# Altium footprint library TranDangKhoa-LIB.PcbLib: 1435 footprints (part 69 of 90)
Each footprint in its own frame and in the unit in brackets; x right, y up, seen from the top. Pads: shape width x height; smd on the part's side, far side on the other; paste and mask are expansions set on the pad; w line width, h text height; cw(c..) or ccw(c..) is an arc to the next point about the centre after c.
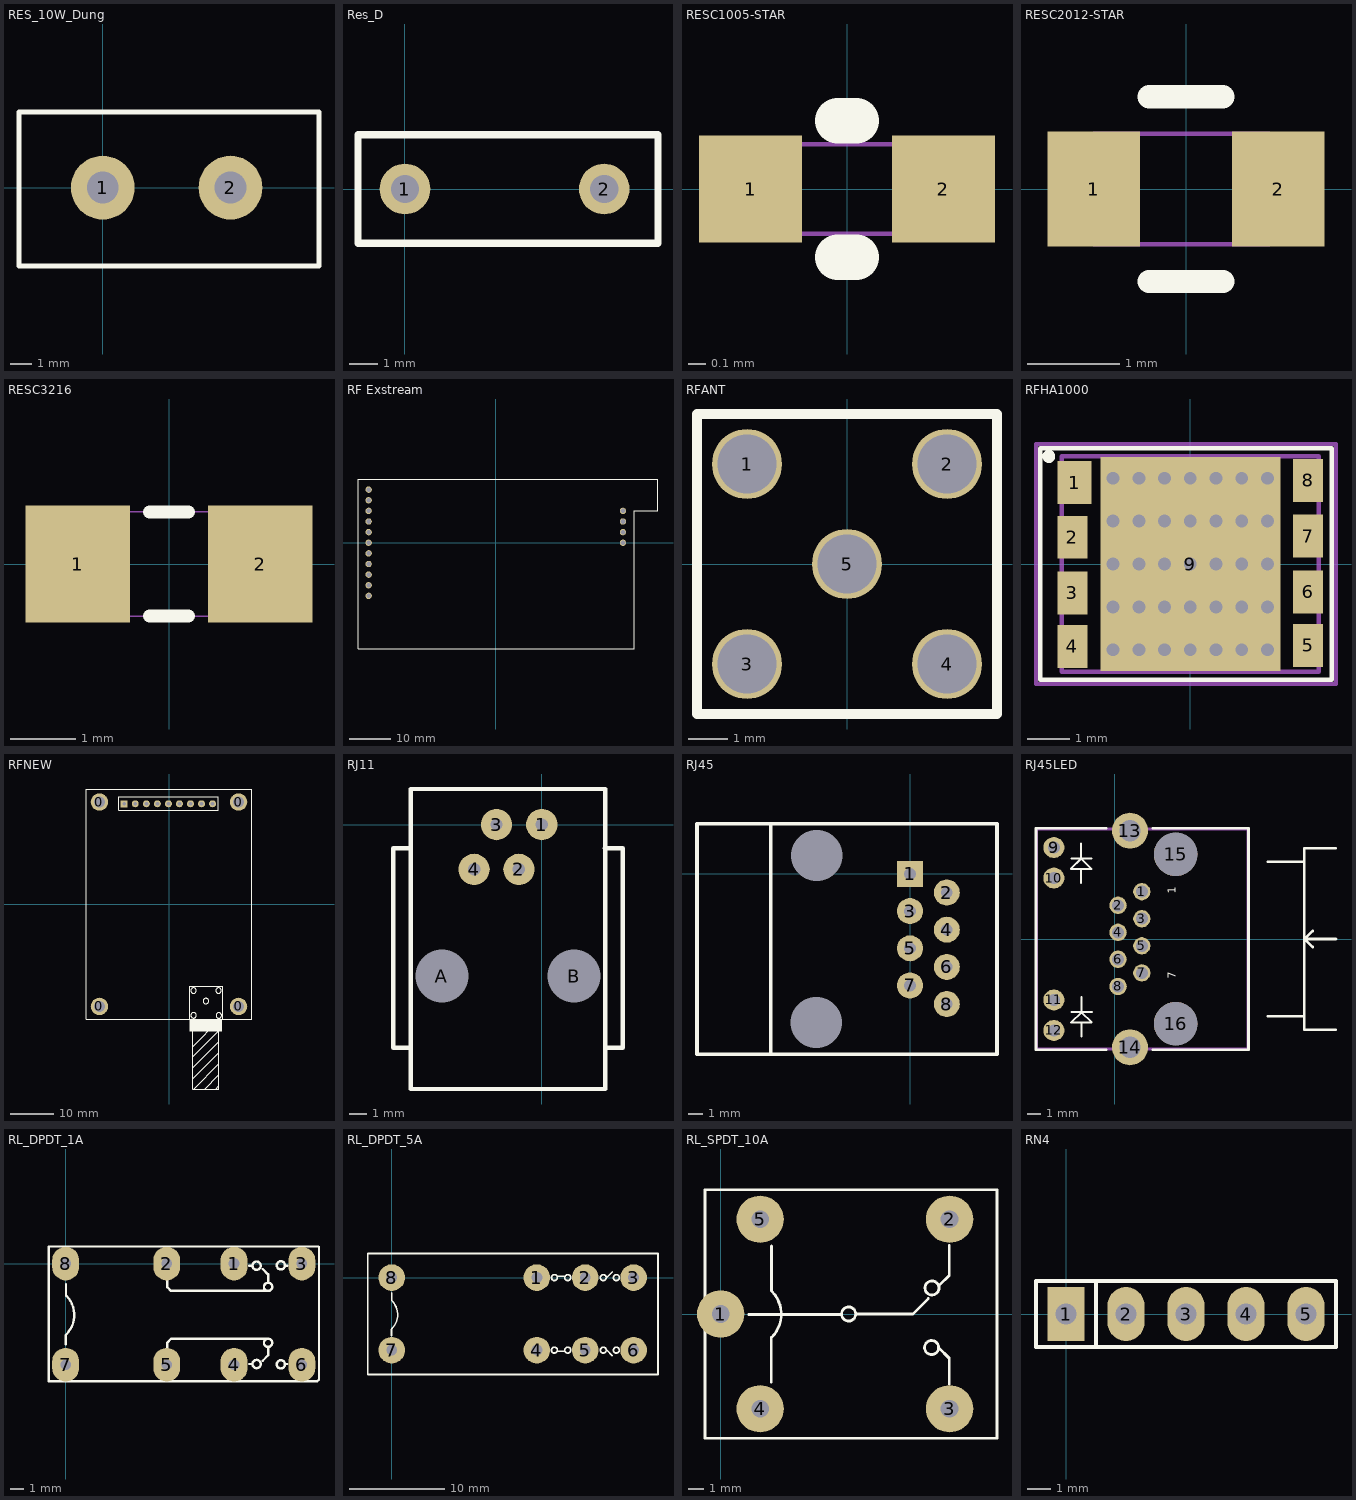
[diagram p68: the footprints below, top view; thin cyan lines are the x and y axes]

## RES_10W_Dung [mm]
pads (2):
  round 3 hole 1.5 unplated: 1(0,0) 2(6,0)
Top Overlay:
  lines w0.254: -3.937,-3.683 -3.937,0 -3.937,3.556 10.16,3.556 10.16,-3.683 -3.937,-3.683

## Res_D [mil]
pads (2):
  round 70 hole 39.37 unplated: 1(0,0) 2(275.59,0)
Top Overlay:
  lines w10: -50,75 350,75 350,-75 -65,-75 -65,75 -35,75

## RESC1005-STAR [mm]
pads (2):
  rect 0.575x0.6 smd: 1(-0.538,0) 2(0.538,0)
Top Overlay:
  lines w0.254: -0.051,-0.381 0.051,-0.381 ; -0.051,0.381 0.051,0.381
Mechanical 7:
  lines w0.025: -0.5,-0.25 0.5,-0.25 0.5,0.25 -0.5,0.25 -0.5,-0.25
  text ".Comment" at -0.475,-0.2 h0.14
  text ".Designator" at -0.475,0.075 h0.14
3D body: height 0.25, standoff 0, extent -0.325,-0.252 0.386,0.256
3D body: height 0.1, standoff 0, extent -0.705,-0.251 -0.326,0.256
3D body: height 0.1, standoff 0, extent 0.387,-0.251 0.716,0.256

## RESC2012-STAR [mm]
pads (2):
  rect 1x1.25 smd: 1(-1,0) 2(1,0)
Top Overlay:
  lines w0.25: -0.4,-1 0.4,-1
  lines w0.254: -0.4,1 0.4,1
Mechanical 7:
  lines w0.05: -1,-0.6 -1,0.6 0.9,0.6 0.9,-0.6 -1,-0.6
  text ".Designator" at -0.9,0.15 h0.4
  text ".Comment" at -0.9,-0.475 h0.4
3D body: height 0.1, standoff 0, extent -1.031,-0.535 -0.576,0.565
3D body: height 0.1, standoff 0, extent 0.613,-0.535 1.069,0.565
3D body: height 0.25, standoff 0, extent -0.576,-0.544 0.611,0.565

## RESC3216 [mm]
pads (2):
  rect 1.6x1.8 smd: 1(-1.4,0) 2(1.4,0)
Top Overlay:
  lines w0.2: -0.3,-0.8 0.3,-0.8 ; -0.3,0.8 0.3,0.8
Mechanical 7:
  lines w0.025: -1.6,-0.8 -1.6,0.8 1.6,0.8 1.6,-0.8 -1.6,-0.8
  text ".Comment" at -1.5,-0.7 h0.5
  text ".Designator" at -1.5,0.4 h0.5
3D body: height 0.55, standoff 0, extent -1.334,-0.792 -0.71,0.85
3D body: height 0.55, standoff 0, extent 0.743,-0.809 1.367,0.833
3D body: height 0.5, standoff 0, extent -0.752,-0.765 0.816,0.801

## RF Exstream [mil] "Modul RF maxstream 900MHz"
pads (15):
  round 60 hole 43.31: 1(-1197.5,500) 2(-1197.5,400) 3(-1197.5,300) 4(-1197.5,200) 5(-1197.5,100) 6(-1197.5,0) 7(-1197.5,-100) 8(-1197.5,-200) 9(-1197.5,-300) 10(-1197.5,-400) 11(-1197.5,-500) 12(1197.5,300) 13(1197.5,200) 14(1197.5,100) 15(1197.5,0)
Top Overlay:
  lines w10: -1297.5,-1000 1302.5,-1000 1302.5,300 1527.5,300 1527.5,600 -1297.5,600 -1297.5,-1000

## RFANT [mil]
pads (5):
  round 70 hole 59.06 unplated: 1(-100,100) 2(100,100) 3(-100,-100) 4(100,-100) 5(0,0)
Top Overlay:
  lines w10: -150,-150 150,-150 150,150 -150,150 -150,100 -150,-150

## RFHA1000 [mm]
pads (9):
  rect 0.8x1 smd mask+0.01: 1(-2.7,1.9)
  rect 0.7x1 smd mask+0.01: 2(-2.75,0.625) 3(-2.75,-0.675) 4(-2.75,-1.925) 5(2.75,-1.9) 6(2.75,-0.65) 7(2.75,0.65) 8(2.75,1.95)
  rect 4.2x5 smd mask+0.01: 9(0,0)
via 1.8,-2 diameter 0.6 hole 0.3
via 1.2,-2 diameter 0.6 hole 0.3
via 0.6,-2 diameter 0.6 hole 0.3
via 0,-2 diameter 0.6 hole 0.3
via -0.6,-2 diameter 0.6 hole 0.3
via -1.2,-2 diameter 0.6 hole 0.3
via -1.8,-2 diameter 0.6 hole 0.3
via 1.8,-1 diameter 0.6 hole 0.3
via 1.2,-1 diameter 0.6 hole 0.3
via 0.6,-1 diameter 0.6 hole 0.3
via 0,-1 diameter 0.6 hole 0.3
via -0.6,-1 diameter 0.6 hole 0.3
via -1.2,-1 diameter 0.6 hole 0.3
via -1.8,-1 diameter 0.6 hole 0.3
via 1.8,0 diameter 0.6 hole 0.3
via 1.2,0 diameter 0.6 hole 0.3
via 0.6,0 diameter 0.6 hole 0.3
via 0,0 diameter 0.6 hole 0.3
via -0.6,0 diameter 0.6 hole 0.3
via -1.2,0 diameter 0.6 hole 0.3
via -1.8,0 diameter 0.6 hole 0.3
via 1.8,1 diameter 0.6 hole 0.3
via 1.2,1 diameter 0.6 hole 0.3
via 0.6,1 diameter 0.6 hole 0.3
via 0,1 diameter 0.6 hole 0.3
via -0.6,1 diameter 0.6 hole 0.3
via -1.2,1 diameter 0.6 hole 0.3
via -1.8,1 diameter 0.6 hole 0.3
via 1.8,2 diameter 0.6 hole 0.3
via 1.2,2 diameter 0.6 hole 0.3
via 0.6,2 diameter 0.6 hole 0.3
via 0,2 diameter 0.6 hole 0.3
via -0.6,2 diameter 0.6 hole 0.3
via -1.2,2 diameter 0.6 hole 0.3
via -1.8,2 diameter 0.6 hole 0.3
Top Overlay:
  lines w0.1: -3.5,-2.7 3.3,-2.7 3.3,2.7 -3.5,2.7 -3.5,-2.7
  lines w0.254: -3.323,2.513 cw(c-3.301,2.51) -3.321,2.5
Mechanical 13:
  lines w0.1: -2.997,-2.514 -2.997,2.515 2.997,2.515 2.997,-2.514 -2.997,-2.514
Mechanical 15:
  lines w0.1: -3.6,-2.8 3.4,-2.8 3.4,2.8 -3.6,2.8 -3.6,-2.8
3D body "RFHA1000.STEP": height 1.98, standoff 0, extent -2.997,-2.514 2.997,2.515

## RFNEW [mm] "Module RF"
height 10
pads (13):
  round 4 hole 2.5: 0(-16,-23.5) 0(-16,23.5) 0(16,-23.5) 0(16,23.5)
  rect 1.6x1.6 hole 0.9: 1(-10.3,23.1)
  round 1.6 hole 0.9: 2(-7.76,23.1) 3(-5.22,23.1) 4(-2.68,23.1) 5(-0.14,23.1) 6(2.4,23.1) 7(4.94,23.1) 8(7.48,23.1) 9(10.02,23.1)
Top Overlay:
  circle w0.254: c8.497,-22.275 r0.635
  circle w0.254: c5.652,-19.862 r0.635
  circle w0.254: c11.392,-19.862 r0.635
  circle w0.254: c11.455,-25.586 r0.635
  circle w0.254: c5.652,-25.551 r0.635
  rectangle: 4.724,-29.318 12.192,-26.492
  lines w0.2: 5.5,-40.171 11.5,-34.171 ; 5.5,-37.631 11.5,-31.631 ; 5.5,-29.091 8.04,-26.551 ; 5.506,-35.085 11.5,-29.091 ; 5.582,-32.621 11.5,-26.703 ; 5.785,-42.426 11.5,-36.711 ; 8.251,-42.5 11.5,-39.251 ; 10.791,-42.5 11.5,-41.791 ; -11.57,21.59 11.29,21.59 11.29,24.765 -11.57,24.765 -11.57,21.59
  lines w0.254: 5.5,-26.5 5.5,-42.5 11.5,-42.5 11.5,-26.5 ; -19,-26.5 19,-26.5 19,26.5 -19,26.5 -19,-26.5 ; 4.724,-26.5 4.724,-20.15 4.724,-18.88 12.344,-18.88 12.344,-26.5 4.724,-26.5

## RJ11 [mil]
pads (6):
  round 70 hole 27.56 unplated: 1(0,0) 2(-51,-100) 3(-101,0) 4(-151,-100)
  round 70 hole 118.11 unplated: A(-223,-337.7) B(72.28,-337.7)
Top Overlay:
  lines w10: -291.9,-497.7 -331.27,-497.7 -331.27,-52.7 -291.9,-52.7 ; 140,-52.7 180.54,-52.7 180.54,-497.7 141.17,-497.7 ; -291.9,-589.55 141.17,-589.55 141.17,79.3 -291.9,79.3 -291.9,-589.55

## RJ45 [mil]
pads (10):
  rect 70x70 hole 31.5 unplated: 1(0,0)
  round 70 hole 31.5 unplated: 2(99,-50) 3(0,-100) 4(99,-150) 5(0,-200) 6(99,-250) 7(0,-300) 8(99,-350)
  round 70 hole 137.8 unplated: ""(-252,-400) ""(-251,50)
Top Overlay:
  lines w10: -375,-485.04 -375,135.04 -306,135.04 ; -573.05,-485.04 -510,-485.04 -408,-485.04 50,-485.04 148,-485.04 234.04,-485.04 234.04,135.04 148.37,135.03 50,135.04 -414,135.04 -509,135.04 -573.05,135.04 -573.05,-485.04

## RJ45LED [mm]
pads (16):
  round 1.3 hole 0.9: 1(2.03,3.55) 2(0.25,2.53) 3(2.03,1.52) 4(0.25,0.5) 5(2.03,-0.51) 6(0.25,-1.52) 7(2.03,-2.54) 8(0.25,-3.56)
  round 1.575 hole 0.9: 9(-4.57,6.86) 10(-4.57,4.57) 11(-4.57,-4.57) 12(-4.57,-6.86)
  round 2.7 hole 1.6: 13(1.14,8.13) 14(1.14,-8.13)
  round 3.25 hole 3.25 unplated: 15(4.57,6.35) 16(4.57,-6.35)
Top Overlay:
  lines w0.15: -3.26,6.04 -1.74,6.04 ; -3.24,-5.48 -1.72,-5.48 ; -2.53,4.22 -2.53,5.26 ; -2.53,7.15 -2.53,6.03 -1.76,5.26 -3.29,5.26 -2.51,6.04 ; -2.51,-7.3 -2.51,-6.26 ; -2.51,-4.37 -2.51,-5.49 -1.74,-6.26 -3.27,-6.26 -2.49,-5.48
  lines w0.2: -0.66,-8.3 -5.91,-8.3 -5.91,8.3 -0.66,8.3 ; 2.86,-8.3 10.03,-8.3 10.03,8.3 2.86,8.3 ; 11.5,-5.8 14.23,-5.8 ; 11.5,5.8 14.23,5.8 ; 14.85,-0.6 14.25,0 ; 14.85,0.6 14.25,0 ; 16.58,-6.8 14.23,-6.8 14.23,6.8 16.58,6.8 ; 16.6,0 14.25,0
  text "1" at 4.58,3.4 h0.6
  text "7" at 4.58,-3 h0.6
Mechanical 16:
  lines w0.254: -5.87,-8.25 -5.87,8.25 10.03,8.25 10.03,-8.15 9.93,-8.25 -5.87,-8.25
Mechanical 29:
  text ".Designator" at 0.5,2 h1.52
3D body "c-2-406549-1-r4-3d.stp": height 14.8, standoff -3.92, extent -5.9,-9.3 10.821,9.328

## RL_DPDT_1A [mil] "Reley DPDT, 8 pin, 1A, W400mil, L800mil,H 300mil"
height 300
pads (8):
  oval 80x100 hole 32: 1(500,0) 2(300,0) 3(701,0) 4(500,-300) 5(300,-300) 6(701,-300) 7(0,-300) 8(0,0)
Top Overlay:
  circle w7: c638.76,-5 r12.24
  circle w7: c566.76,-6 r12.24
  circle w7: c600.76,-69 r12.24
  circle w7: c600.76,-235 r12.24
  circle w7: c566.76,-298 r12.24
  circle w7: c638.76,-299 r12.24
  lines w7: 0,-239 0,-212 ; 1,-211 ccw(c-56.5,-152.5) 2,-95 ; 1,-94 1,-61 ; 302,-255 302,-234 313,-223 599,-223 ; 302,-42 302,-70 313,-81 599,-81 ; 544,-298 552,-298 ; 544,-6 552,-6 ; 585,-288 601,-272 601,-249 ; 585,-16 601,-32 601,-55 ; 653,-298 658,-298 ; 653,-6 658,-6 ; -50,-349 747,-349 752,-344 752,49 750,51 -50,51 -50,-349
3D body "SW3dPS-DSY2Y.STEP": height 484.25, standoff -118.11, extent -59.45,-340 759.45,45.83

## RL_DPDT_5A [mil] "Reley DPDT, 8 pin, 5A, W500mil, L1100mil,H 950mil"
height 300
pads (8):
  round 110 hole 45: 1(600,0) 2(800,0) 3(1000,0) 4(600,-300) 5(800,-300) 6(1000,-300) 7(0,-300) 8(0,0)
Top Overlay:
  circle w7: c928.76,0 r12.24
  circle w7: c874.76,0 r12.24
  circle w7: c727.76,0 r12.24
  circle w7: c672.76,0 r12.24
  circle w7: c672.76,-300 r12.24
  circle w7: c727.76,-300 r12.24
  circle w7: c874.76,-300 r12.24
  circle w7: c928.76,-300 r12.24
  lines w7: -1,-240 -1,-213 ; 0,-212 ccw(c-57.5,-153.5) 1,-96 ; 0,-95 0,-62 ; 687,-305 716,-305 ; 687,5 716,5 ; 888,-299 912,-323 ; 888,-1 912,23 ; -99,-401 -99,100 1101,100 1101,-401 -99,-401

## RL_SPDT_10A [mil] "Relay SPDT, 5 pin, 10A,W 650mil, L 800mil, H 800mil"
height 800
pads (5):
  round 120 hole 45: 1(0,0) 2(580,240) 3(580,-240) 4(100,-240) 5(100,240)
Top Overlay:
  circle w7: c324.2,0 r17.8
  circle w7: c535.2,66 r17.8
  circle w7: c534.2,-85 r17.8
  lines w7: 71,-1 304,-1 ; 128,-173 128,-60 ; 129,-59 ccw(c71.5,-0.5) 130,57 ; 129,58 129,172 ; 344,0 487,0 526,39 ; 552,-85 579,-112 579,-178 ; 553,72 579,98 579,174 ; -40,-315 700,-315 700,315 -40,315 -40,-315
3D body "User Library-SONGLE Relay SRU-12VDC-SL-C.STEP": height 641.73, standoff -157.48, extent -33.46,-307.08 718.51,303.15

## RN4 [mil] "R SIP4, 5 Pin"
height 200
pads (5):
  rect 62x90 hole 35: 1(0,0)
  oval 62x90 hole 35: 2(100,0) 3(200,0) 4(300,0) 5(400,0)
Top Overlay:
  lines w7: 50,-55 50,55 ; -50,-55 -50,55 450,55 450,-55 -50,-55
3D body "User Library-Resistor network 5A474J.STEP": height 251.65, standoff -86.14, extent -45.27,-47.24 454.71,51.58